# Altium footprint library THU VIEN V1.PcbLib: 400 footprints (part 9 of 25)
Each footprint in its own frame and in the unit in brackets; x right, y up, seen from the top. Pads: shape width x height; smd on the part's side, far side on the other; paste and mask are expansions set on the pad; w line width, h text height; cw(c..) or ccw(c..) is an arc to the next point about the centre after c.
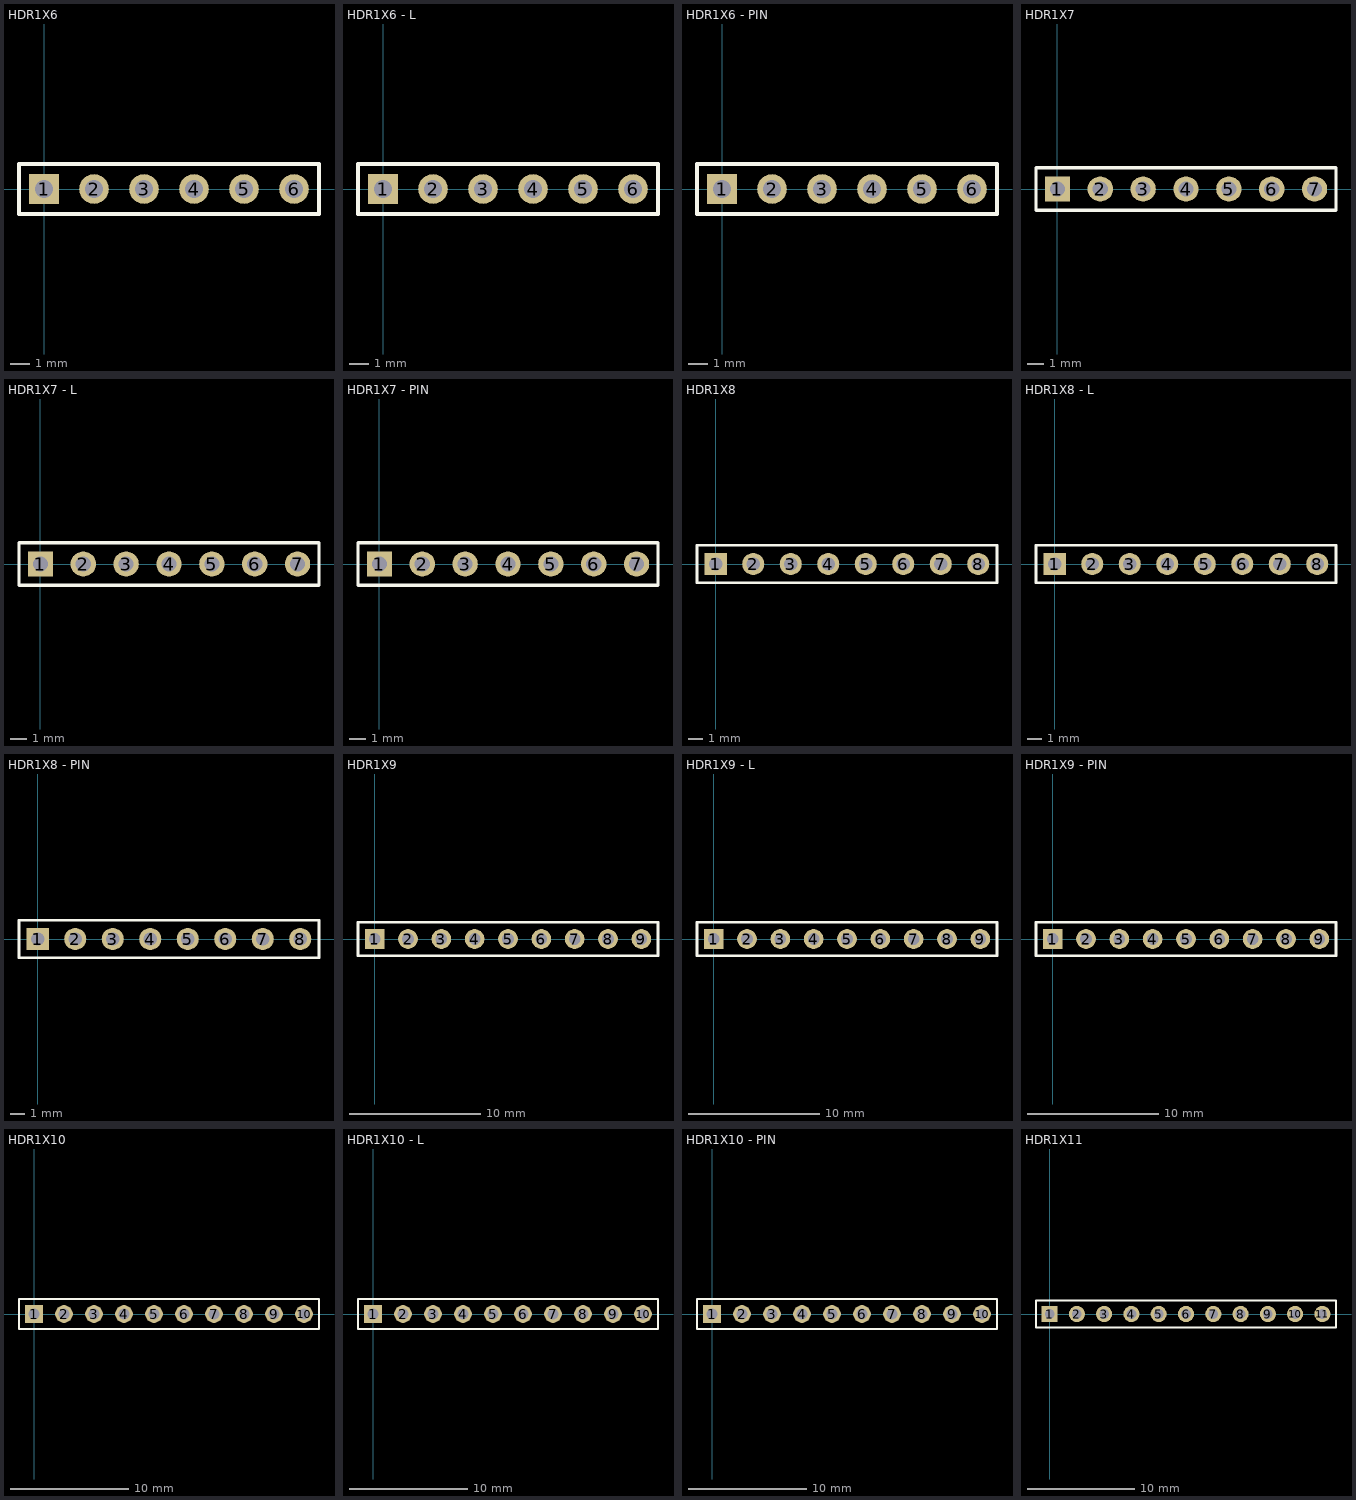
[diagram p8: the footprints below, top view; thin cyan lines are the x and y axes]

## HDR1X6 [mm] "Connector; Header; 6 Position"
pads (6):
  rect 1.5x1.5 hole 0.9: 1(0,0)
  round 1.5 hole 0.9: 2(2.54,0) 3(5.08,0) 4(7.62,0) 5(10.16,0) 6(12.7,0)
Top Overlay:
  lines w0.2: -1.27,-1.27 -1.27,1.27 13.97,1.27 13.97,-1.27 -1.27,-1.27
3D body: height 8.55, standoff -2.43, extent 8.89,-1.295 13.97,1.245
3D body: height 8.55, standoff -2.43, extent 3.81,-1.295 8.89,1.245
3D body: height 8.55, standoff -2.43, extent -1.27,-1.295 3.81,1.245

## HDR1X6 - L [mm] "Connector; Header; 6 Position"
pads (6):
  rect 1.5x1.5 hole 0.9: 1(0,0)
  round 1.5 hole 0.9: 2(2.54,0) 3(5.08,0) 4(7.62,0) 5(10.16,0) 6(12.7,0)
Top Overlay:
  lines w0.2: -1.27,-1.27 13.97,-1.27 13.97,1.27 -1.27,1.27 -1.27,-1.27
3D body: height 4.33, standoff -3, extent -1.321,-1.194 13.919,7.076

## HDR1X6 - PIN [mm] "Connector; Header; 6 Position"
pads (6):
  rect 1.5x1.5 hole 0.9: 1(0,0)
  round 1.5 hole 0.9: 2(2.54,0) 3(5.08,0) 4(7.62,0) 5(10.16,0) 6(12.7,0)
Top Overlay:
  lines w0.2: -1.27,-1.27 -1.27,1.27 13.97,1.27 13.97,-1.27 -1.27,-1.27
3D body: height 6.02, standoff -3.1, extent 6.299,-1.27 13.919,1.27
3D body: height 6.02, standoff -3.1, extent -1.27,-1.27 6.35,1.27

## HDR1X7 [mm] "Connector; Header; 7 Position"
pads (7):
  rect 1.5x1.5 hole 0.9: 1(0,0)
  round 1.5 hole 0.9: 2(2.54,0) 3(5.08,0) 4(7.62,0) 5(10.16,0) 6(12.7,0) 7(15.24,0)
Top Overlay:
  lines w0.2: -1.27,-1.27 16.51,-1.27 16.51,1.27 -1.27,1.27 -1.27,-1.27
3D body: height 8.55, standoff -2.43, extent -1.233,-1.212 3.847,1.328
3D body: height 8.55, standoff -2.43, extent 1.219,-1.245 6.299,1.295
3D body: height 8.55, standoff -2.43, extent 6.361,-1.212 11.441,1.328
3D body: height 8.55, standoff -2.43, extent 11.416,-1.212 16.496,1.328

## HDR1X7 - L [mm] "Connector; Header; 7 Position"
pads (7):
  rect 1.5x1.5 hole 0.9: 1(0,0)
  round 1.5 hole 0.9: 2(2.54,0) 3(5.08,0) 4(7.62,0) 5(10.16,0) 6(12.7,0) 7(15.24,0)
Top Overlay:
  lines w0.2: -1.27,-1.27 16.51,-1.27 16.51,1.27 -1.27,1.27 -1.27,-1.27
3D body: height 4.33, standoff -3, extent -1.27,-1.27 16.51,7

## HDR1X7 - PIN [mm] "Connector; Header; 7 Position"
pads (7):
  rect 1.5x1.5 hole 0.9: 1(0,0)
  round 1.5 hole 0.9: 2(2.54,0) 3(5.08,0) 4(7.62,0) 5(10.16,0) 6(12.7,0) 7(15.24,0)
Top Overlay:
  lines w0.2: -1.27,-1.27 16.51,-1.27 16.51,1.27 -1.27,1.27 -1.27,-1.27
3D body: height 6.02, standoff -3.1, extent 6.375,-1.27 16.535,1.27
3D body: height 6.02, standoff -3.1, extent -1.194,-1.27 6.426,1.27

## HDR1X8 [mm] "Connector; Header; 8 Position"
pads (8):
  rect 1.5x1.5 hole 0.9: 1(0,0)
  round 1.5 hole 0.9: 2(2.54,0) 3(5.08,0) 4(7.62,0) 5(10.16,0) 6(12.7,0) 7(15.24,0) 8(17.78,0)
Top Overlay:
  lines w0.2: -1.27,-1.27 19.05,-1.27 19.05,1.27 -1.27,1.27 -1.27,-1.27
3D body: height 8.55, standoff -2.43, extent -1.219,-1.245 3.861,1.295
3D body: height 8.55, standoff -2.43, extent 3.861,-1.245 8.941,1.295
3D body: height 8.55, standoff -2.43, extent 8.865,-1.245 13.945,1.295
3D body: height 8.55, standoff -2.43, extent 13.843,-1.245 18.923,1.295

## HDR1X8 - L [mm] "Connector; Header; 8 Position"
pads (8):
  rect 1.5x1.5 hole 0.9: 1(0,0)
  round 1.5 hole 0.9: 2(2.54,0) 3(5.08,0) 4(7.62,0) 5(10.16,0) 6(12.7,0) 7(15.24,0) 8(17.78,0)
Top Overlay:
  lines w0.2: -1.27,-1.27 19.05,-1.27 19.05,1.27 -1.27,1.27 -1.27,-1.27
3D body: height 4.33, standoff -3, extent 8.839,-1.321 18.999,6.949
3D body: height 4.33, standoff -3, extent -1.244,-1.295 8.916,6.975

## HDR1X8 - PIN [mm] "Connector; Header; 8 Position"
pads (8):
  rect 1.5x1.5 hole 0.9: 1(0,0)
  round 1.5 hole 0.9: 2(2.54,0) 3(5.08,0) 4(7.62,0) 5(10.16,0) 6(12.7,0) 7(15.24,0) 8(17.78,0)
Top Overlay:
  lines w0.2: -1.27,-1.27 -1.27,1.27 19.05,1.27 19.05,-1.27 -1.27,-1.27
3D body: height 6.02, standoff -3.1, extent -1.245,-1.27 8.915,1.27
3D body: height 6.02, standoff -3.1, extent 8.915,-1.27 19.075,1.27

## HDR1X9 [mm] "Connector; Header; 9 Position"
pads (9):
  rect 1.5x1.5 hole 0.9: 1(0,0)
  round 1.5 hole 0.9: 2(2.54,0) 3(5.08,0) 4(7.62,0) 5(10.16,0) 6(12.7,0) 7(15.24,0) 8(17.78,0) 9(20.32,0)
Top Overlay:
  lines w0.2: -1.27,-1.27 -1.27,1.27 21.59,1.27 21.59,-1.27 -1.27,-1.27
3D body: height 8.52, standoff -2.48, extent 8.89,-1.25 21.59,1.25
3D body: height 8.55, standoff -2.43, extent 3.785,-1.295 8.865,1.245
3D body: height 8.55, standoff -2.43, extent -1.208,-1.314 3.872,1.226

## HDR1X9 - L [mm] "Connector; Header; 9 Position"
pads (9):
  rect 1.5x1.5 hole 0.9: 1(0,0)
  round 1.5 hole 0.9: 2(2.54,0) 3(5.08,0) 4(7.62,0) 5(10.16,0) 6(12.7,0) 7(15.24,0) 8(17.78,0) 9(20.32,0)
Top Overlay:
  lines w0.2: -1.27,-1.27 -1.27,1.27 21.59,1.27 21.59,-1.27 -1.27,-1.27
3D body: height 4.33, standoff -3, extent -1.092,-1.265 9.068,7.005
3D body: height 4.33, standoff -3, extent 8.89,-1.27 21.59,7

## HDR1X9 - PIN [mm] "Connector; Header; 9 Position"
pads (9):
  rect 1.5x1.5 hole 0.9: 1(0,0)
  round 1.5 hole 0.9: 2(2.54,0) 3(5.08,0) 4(7.62,0) 5(10.16,0) 6(12.7,0) 7(15.24,0) 8(17.78,0) 9(20.32,0)
Top Overlay:
  lines w0.2: -1.27,-1.27 21.59,-1.27 21.59,1.27 -1.27,1.27 -1.27,-1.27
3D body: height 6.02, standoff -3.1, extent -1.143,-1.245 6.477,1.295
3D body: height 6.02, standoff -3.1, extent 6.401,-1.245 14.021,1.295
3D body: height 6.02, standoff -3.1, extent 13.97,-1.245 21.59,1.295

## HDR1X10 [mm] "Connector; Header; 10 Position"
pads (10):
  rect 1.5x1.5 hole 0.9: 1(0,0)
  round 1.5 hole 0.9: 2(2.54,0) 3(5.08,0) 4(7.62,0) 5(10.16,0) 6(12.7,0) 7(15.24,0) 8(17.78,0) 9(20.32,0) 10(22.86,0)
Top Overlay:
  lines w0.2: -1.27,-1.27 24.13,-1.27 24.13,1.27 0.635,1.27 -1.27,1.27 -1.27,-1.27
3D body: height 8.55, standoff -2.43, extent -1.118,-1.321 3.962,1.219
3D body: height 8.55, standoff -2.43, extent 3.861,-1.295 8.941,1.245
3D body: height 8.55, standoff -2.43, extent 8.966,-1.295 14.046,1.245
3D body: height 8.55, standoff -2.43, extent 13.995,-1.27 19.075,1.27
3D body: height 8.55, standoff -2.43, extent 19.075,-1.27 24.155,1.27

## HDR1X10 - L [mm] "Connector; Header; 10 Position"
pads (10):
  rect 1.5x1.5 hole 0.9: 1(0,0)
  round 1.5 hole 0.9: 2(2.54,0) 3(5.08,0) 4(7.62,0) 5(10.16,0) 6(12.7,0) 7(15.24,0) 8(17.78,0) 9(20.32,0) 10(22.86,0)
Top Overlay:
  lines w0.2: -1.27,-1.27 24.13,-1.27 24.13,1.27 0.635,1.27 -1.27,1.27 -1.27,-1.27
3D body: height 4.33, standoff -3, extent -1.27,-1.27 11.43,7
3D body: height 4.33, standoff -3, extent 11.43,-1.27 24.13,7

## HDR1X10 - PIN [mm] "Connector; Header; 10 Position"
pads (10):
  rect 1.5x1.5 hole 0.9: 1(0,0)
  round 1.5 hole 0.9: 2(2.54,0) 3(5.08,0) 4(7.62,0) 5(10.16,0) 6(12.7,0) 7(15.24,0) 8(17.78,0) 9(20.32,0) 10(22.86,0)
Top Overlay:
  lines w0.2: -1.27,-1.27 24.13,-1.27 24.13,1.27 0.635,1.27 -1.27,1.27 -1.27,-1.27
3D body: height 6.02, standoff -3.1, extent 13.919,-1.295 24.079,1.245
3D body: height 6.02, standoff -3.1, extent 6.299,-1.295 13.919,1.245
3D body: height 6.02, standoff -3.1, extent -1.295,-1.27 6.325,1.27

## HDR1X11 [mm] "Connector; Header; 11 Position"
pads (11):
  rect 1.5x1.5 hole 0.9: 1(0,0)
  round 1.5 hole 0.9: 2(2.54,0) 3(5.08,0) 4(7.62,0) 5(10.16,0) 6(12.7,0) 7(15.24,0) 8(17.78,0) 9(20.32,0) 10(22.86,0) 11(25.4,0)
Top Overlay:
  lines w0.2: -1.27,-1.27 26.67,-1.27 26.67,1.27 0.635,1.27 -1.27,1.27 -1.27,-1.27
3D body: height 8.55, standoff -2.43, extent -1.168,-1.346 3.912,1.194
3D body: height 8.55, standoff -2.43, extent 3.897,-1.314 8.977,1.226
3D body: height 8.55, standoff -2.43, extent 8.901,-1.263 13.981,1.277
3D body: height 8.52, standoff -2.48, extent 13.97,-1.25 26.67,1.25